# Altium footprint library Angler.PcbLib: 331 footprints (part 11 of 21)
Each footprint in its own frame and in the unit in brackets; x right, y up, seen from the top. Pads: shape width x height; smd on the part's side, far side on the other; paste and mask are expansions set on the pad; w line width, h text height; cw(c..) or ccw(c..) is an arc to the next point about the centre after c.
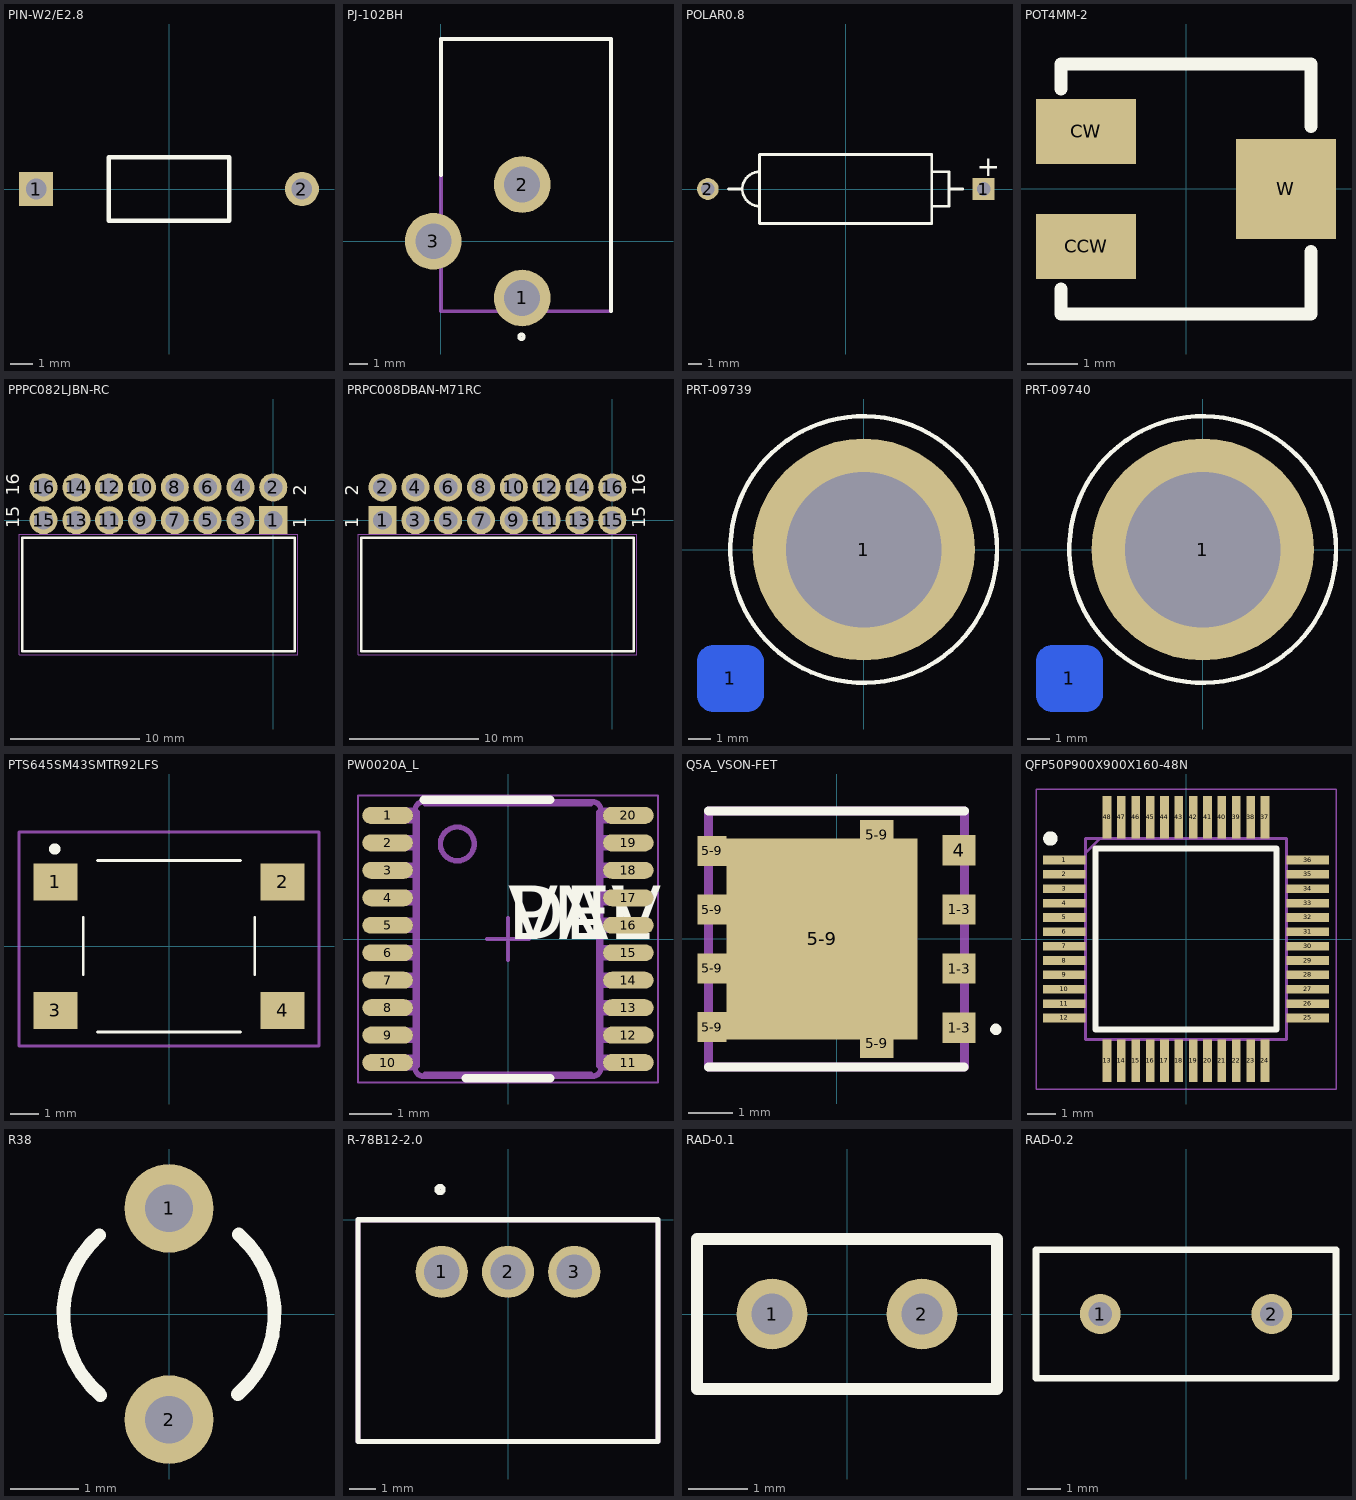
[diagram p10: the footprints below, top view; thin cyan lines are the x and y axes]

## PIN-W2/E2.8 [mm] "Thru-Hole; 2 Leads"
pads (2):
  rect 1.5x1.5 hole 0.9: 1(-5.825,0)
  round 1.5 hole 0.9: 2(5.825,0)
Top Overlay:
  lines w0.2: -2.65,-1.4 2.65,-1.4 2.65,1.4 -2.65,1.4 -2.65,-1.4

## PJ-102BH [mm]
height 11
pads (3):
  round 3 hole 1.9: 1(4.3,-3) 2(4.3,3) 3(-0.4,0)
Top Overlay:
  circle w0.2: c4.261,-5.051 r0.119
  lines w0.2: 0,3.5 0,10.7 9,10.7 9,-3.7
Mechanical 13:
  lines w0.2: 0,-3.7 0,10.7 9,10.7 9,-3.7 0,-3.7
3D body "PJ-102BH.stp": height 11, standoff -3.5, extent -0.381,-3.644 9.019,10.756

## POLAR0.8 [mm] "Polarized Capacitor; 2 Leads"
height 5.08
pads (2):
  rect 1.6x1.6 hole 1: 1(10.16,0)
  round 1.6 hole 1: 2(-10.16,0)
Top Overlay:
  lines w0.2: -8.636,0 -7.62,0 ; -6.35,-1.27 cw(c-6.35,0) -6.35,1.27 ; 6.35,-1.27 7.62,-1.27 7.62,1.27 6.35,1.27 ; 7.62,0 8.636,0 ; -6.35,-2.54 6.35,-2.54 6.35,2.54 -6.35,2.54 -6.35,-2.54
  text "+" at 9.652,0.95 h1.5

## POT4MM-2 [mm] "Square Trimming Potentiometer"
pads (3):
  rect 2x1.3 smd: CCW(-2,-1.15) CW(-2,1.15)
  rect 2x2 smd: W(2,0)
Top Overlay:
  lines w0.254: -2.5,-2 -2.5,-2.5 2.5,-2.5 2.5,-1.25 ; -2.5,2 -2.5,2.5 2.5,2.5 2.5,1.25

## PPPC082LJBN-RC [mm]
pads (16):
  rect 2.175x2.175 hole 1.45: 1(0,0)
  round 2.175 hole 1.45: 2(0,2.54) 3(-2.54,0) 4(-2.54,2.54) 5(-5.08,0) 6(-5.08,2.54) 7(-7.62,0) 8(-7.62,2.54) 9(-10.16,0) 10(-10.16,2.54) 11(-12.7,0) 12(-12.7,2.54) 13(-15.24,0) 14(-15.24,2.54) 15(-17.78,0) 16(-17.78,2.54)
Top Overlay:
  lines w0.2: 1.65,-10.16 -19.43,-10.16 -19.43,-1.35 1.65,-1.35 1.65,-10.15
  text "15" at -19.68,-0.635 h1
  text "16" at -19.68,1.905 h1
  text "1" at 2.54,-0.635 h1
  text "2" at 2.54,1.905 h1
Mechanical 13:
  lines w0.1: -19.43,-10.16 1.65,-10.16 1.65,-1.35 -19.43,-1.35 -19.43,-10.16
Mechanical 15:
  lines w0.05: -19.68,-10.41 1.9,-10.41 1.9,-1.1 -19.68,-1.1 -19.68,-10.41
3D body "SFH11-PBPC-D08-RA-BK.STEP": height 5.08, standoff -3.15, extent -19.3,-10.22 1.52,2.62

## PRPC008DBAN-M71RC [mm]
pads (16):
  rect 2.175x2.175 hole 1.45: 1(-17.78,0)
  round 2.175 hole 1.45: 2(-17.78,2.54) 3(-15.24,0) 4(-15.24,2.54) 5(-12.7,0) 6(-12.7,2.54) 7(-10.16,0) 8(-10.16,2.54) 9(-7.62,0) 10(-7.62,2.54) 11(-5.08,0) 12(-5.08,2.54) 13(-2.54,0) 14(-2.54,2.54) 15(0,0) 16(0,2.54)
Top Overlay:
  lines w0.2: 1.65,-10.16 -19.43,-10.16 -19.43,-1.35 1.65,-1.35 1.65,-10.15
  text "2" at -19.68,1.905 h1
  text "1" at -19.68,-0.635 h1
  text "16" at 2.54,1.905 h1
  text "15" at 2.54,-0.635 h1
Mechanical 13:
  lines w0.1: -19.43,-10.16 -19.43,-1.35 1.65,-1.35 1.65,-10.16 -19.43,-10.16
Mechanical 15:
  lines w0.05: -19.68,-10.41 -19.68,-1.1 1.9,-1.1 1.9,-10.41 -19.68,-10.41
3D body "16_pos.STEP": height 4.99, standoff -3.06, extent -19.06,-9.8 1.26,2.92

## PRT-09739 [mm] "Binding Post Red"
pads (2):
  rrect50% 3x3 smd far side paste-1.27: 1(-6,-5.8)
  round 10 hole 7: 1(0,0)
Top Overlay:
  circle w0.2: c0,0 r6
3D body "Insulated Binding Post.STEP": height 29.41, standoff -18.52, extent -5.786,-5.8 5.7,5.686

## PRT-09740 [mm] "Binding Post Black"
pads (2):
  rrect50% 3x3 smd far side paste-1.27: 1(-6,-5.8)
  round 10 hole 7: 1(0,0)
Top Overlay:
  circle w0.2: c0,0 r6
3D body "Insulated Binding Post Black.STEP": height 29.41, standoff -18.52, extent -5.786,-5.8 5.7,5.686

## PTS645SM43SMTR92LFS [mm]
pads (4):
  rect 1.55x1.3 smd: 1(-3.975,2.25) 2(3.975,2.25) 3(-3.975,-2.25) 4(3.975,-2.25)
Top Overlay:
  lines w0.1: -3,-1 -3,1 ; -2.5,-3 2.5,-3 ; -2.5,3 2.5,3 ; 3,-1 3,1
  lines w0.2: -4.1,3.4 ccw(c-4,3.4) -3.9,3.4 ccw(c-4,3.4) -4.1,3.4
Mechanical 15:
  lines w0.1: -5.25,-3.5 5.25,-3.5 5.25,4 -5.25,4 -5.25,-3.5
3D body "c-2-1437565-9-v-3d.stp": height 4.28, standoff -0.1, extent -5,-3 5,3

## PW0020A_L [mm]
pads (20):
  oval 1.2x0.4 smd paste+0 mask+0: 1(-2.85,2.925) 2(-2.85,2.275) 3(-2.85,1.625) 4(-2.85,0.975) 5(-2.85,0.325) 6(-2.85,-0.325) 7(-2.85,-0.975) 8(-2.85,-1.625) 9(-2.85,-2.275) 10(-2.85,-2.925) 11(2.85,-2.925) 12(2.85,-2.275) 13(2.85,-1.625) 14(2.85,-0.975) 15(2.85,-0.325) 16(2.85,0.325) 17(2.85,0.975) 18(2.85,1.625) 19(2.85,2.275) 20(2.85,2.925)
Top Overlay:
  lines w0.2: -2,3.3 1,3.3 ; -1,-3.3 1,-3.3
  text "VAL" at 0,0 h1.27
  text "DEV" at 0,0 h1.27
  text "PN" at 0,0 h1.27
Mechanical 13:
  drawing of 254 lines, arcs and shapes, not listed
  text ".Designator" at -0.45,1.8 h1.27
Mechanical 15:
  lines w0.05: -3.55,-3.4 -3.55,3.4 3.55,3.4 3.55,-3.4 -3.55,-3.4
  lines w0.1: -0.5,0 0.5,0 ; 0,-0.5 0,0.5
3D body: height 0.25, standoff 0, extent 0,0 0.254,0.254
3D body "PW0020A.stp": height 1.13, standoff 0, extent -3.2,-3.25 3.2,3.25

## Q5A_VSON-FET [mm]
pads (11):
  rect 0.75x0.675 smd: 1-3(2.752,-1.995) 1-3(2.752,-0.665) 1-3(2.752,0.665) 4(2.752,1.995) 5-9(0.9,-2.34) 5-9(0.9,2.34)
  rect 0.655x0.675 smd: 5-9(-2.8,-1.98) 5-9(-2.8,-0.66) 5-9(-2.8,0.66) 5-9(-2.8,1.98)
  rect 4.295x4.51 smd: 5-9(-0.325,0)
Top Overlay:
  circle w0.2: c3.579,-2.03 r0.026
  lines w0.2: -2.88,-2.88 2.87,-2.88 ; -2.875,2.88 2.875,2.88
Mechanical 13:
  lines w0.2: -2.875,-2.88 -2.875,2.88 2.875,2.88 2.875,-2.88 -2.875,-2.88
3D body "DQJ0008A.stp": height 1.15, standoff 0, extent -3.13,-2.45 3.13,2.45

## QFP50P900X900X160-48N [mm]
pads (48):
  rect 1.475x0.3 smd: 1(-4.238,2.75) 2(-4.238,2.25) 3(-4.238,1.75) 4(-4.238,1.25) 5(-4.238,0.75) 6(-4.238,0.25) 7(-4.238,-0.25) 8(-4.238,-0.75) 9(-4.238,-1.25) 10(-4.238,-1.75) 11(-4.238,-2.25) 12(-4.238,-2.75) 25(4.238,-2.75) 26(4.238,-2.25) 27(4.238,-1.75) 28(4.238,-1.25) 29(4.238,-0.75) 30(4.238,-0.25) 31(4.238,0.25) 32(4.238,0.75) 33(4.238,1.25) 34(4.238,1.75) 35(4.238,2.25) 36(4.238,2.75)
  rect 0.3x1.475 smd: 13(-2.75,-4.238) 14(-2.25,-4.238) 15(-1.75,-4.238) 16(-1.25,-4.238) 17(-0.75,-4.238) 18(-0.25,-4.238) 19(0.25,-4.238) 20(0.75,-4.238) 21(1.25,-4.238) 22(1.75,-4.238) 23(2.25,-4.238) 24(2.75,-4.238) 37(2.75,4.238) 38(2.25,4.238) 39(1.75,4.238) 40(1.25,4.238) 41(0.75,4.238) 42(0.25,4.238) 43(-0.25,4.238) 44(-0.75,4.238) 45(-1.25,4.238) 46(-1.75,4.238) 47(-2.25,4.238) 48(-2.75,4.238)
Top Overlay:
  circle w0.25: c-4.725,3.5 r0.125
  lines w0.2: -3.15,-3.15 -3.15,3.15 3.15,3.15 3.15,-3.15 -3.15,-3.15
Mechanical 13:
  lines w0.1: -3.5,3 -3,3.5 ; -3.5,-3.5 -3.5,3.5 3.5,3.5 3.5,-3.5 -3.5,-3.5
Mechanical 15:
  lines w0.05: -5.225,-5.225 -5.225,5.225 5.225,5.225 5.225,-5.225 -5.225,-5.225
3D body "STM32L433CBT6.stp": height 1.6, standoff 0, extent -4.5,-4.5 4.5,4.5

## R38 [mm] "Crystal, Thru-Hole; 2 Leads; Body 3.1 x 8.2 mm (Dia.xH)"
height 8.2
pads (2):
  round 1.3 hole 0.7: 1(0,1.55) 2(0,-1.55)
Top Overlay:
  lines w0.2: -1.022,1.155 ccw(c0,-0.01) -1.006,-1.189 ; 1.006,-1.179 ccw(c0,0) 1.022,1.165

## R-78B12-2.0 [mm]
pads (3):
  round 2 hole 1.35: 1(-2.54,-2) 2(0,-2) 3(2.54,-2)
Top Overlay:
  circle w0.2: c-2.605,1.154 r0.116
  lines w0.2: -5.75,-8.5 5.75,-8.5 5.75,0 -5.75,0 -5.75,-8.5
Mechanical 13:
  lines w0.2: -5.75,-8.5 -5.75,0 5.75,0 5.75,-8.5 -5.75,-8.5
3D body "R-78B-2.0.STEP": height 18, standoff -3.6, extent -5.75,-8.56 5.75,-0.05

## RAD-0.1 [mm] "Radial Cap, Thru-Hole; 2 Leads; 0.1 in Pin Spacing"
pads (2):
  round 1.2 hole 0.7: 1(-1.27,0) 2(1.27,0)
Top Overlay:
  lines w0.2: -2.54,-1.27 2.54,-1.27 2.54,1.27 -2.54,1.27 -2.54,-1.27

## RAD-0.2 [mm] "Radial Cap, Thru-Hole; 2 Leads; 0.2 in Pin Spacing"
pads (2):
  round 1.2 hole 0.7: 1(-2.54,0) 2(2.54,0)
Top Overlay:
  lines w0.2: -4.445,-1.905 -4.445,1.905 4.445,1.905 4.445,-1.905 -4.445,-1.905